# Altium footprint library LimeMicroAltiumLib_pcbLib_r05.PcbLib: 746 footprints (part 27 of 48)
Each footprint in its own frame and in the unit in brackets; x right, y up, seen from the top. Pads: shape width x height; smd on the part's side, far side on the other; paste and mask are expansions set on the pad; w line width, h text height; cw(c..) or ccw(c..) is an arc to the next point about the centre after c.
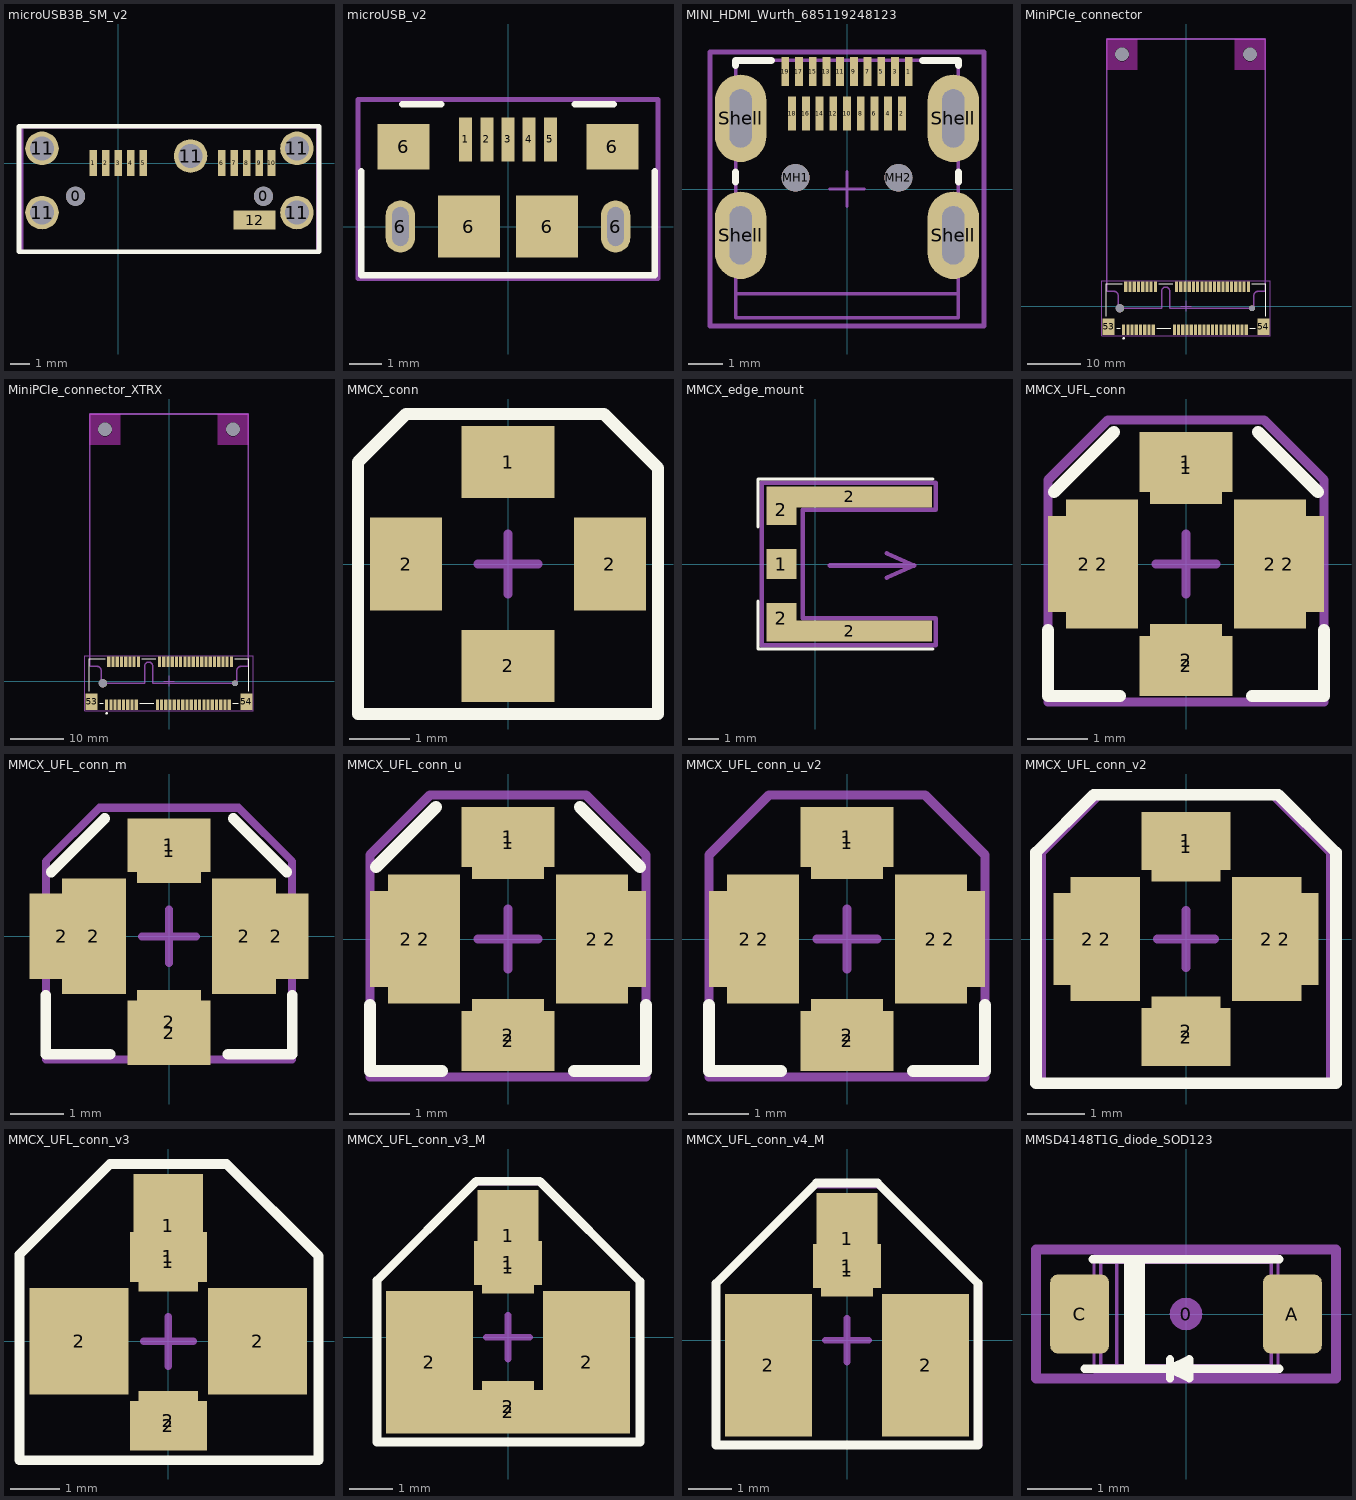
[diagram p26: the footprints below, top view; thin cyan lines are the x and y axes]

## microUSB3B_SM_v2 [mm] "GSB443T33HRCT-ND"
pads (18):
  round 1 hole 1: 0(-2.225,-1.73) 0(7.575,-1.73)
  rect 0.4x1.35 smd mask+0.05: 1(-1.3,0) 2(-0.65,0) 3(0,0) 4(0.65,0) 5(1.3,0) 6(5.4,0) 7(6.05,0) 8(6.7,0) 9(7.35,0) 10(8,0)
  round 1.75 hole 1.25: 11(-3.975,-2.58) 11(-3.975,0.77) 11(3.775,0.37) 11(9.325,-2.58) 11(9.325,0.77)
  rect 2.18x0.98 smd: 12(7.115,-2.97)
Top Overlay:
  lines w0.254: -5.175,-4.625 -5.175,1.925 10.475,1.925 10.475,-4.625 -5.175,-4.625
Mechanical 15:
  lines w0.15: -5.025,-4.625 -5.025,1.875 10.4,1.875 10.4,-4.625 -5.025,-4.625
  text ".Designator" at 2.675,-1.238 h0.55
3D body "USB3110-30-A_revF.step": height 5.73, standoff 2, extent -4.032,-6.525 9.382,-0.607
3D body: height 4, standoff 0, extent -4.032,-4.625 9.382,-0.607

## microUSB_v2 [mm]
pads (11):
  rect 0.4x1.35 smd mask+0.05: 1(-1.3,2.675) 2(-0.65,2.675) 3(0,2.675) 4(0.65,2.675) 5(1.3,2.675)
  oval 0.9x1.6 hole 0.5 slot 1.2 at 90 deg: 6(-3.3,0) 6(3.3,0)
  rect 1.6x1.4 smd: 6(-3.2,2.45) 6(3.2,2.45)
  rect 1.9x1.9 smd: 6(-1.2,0) 6(1.2,0)
Top Overlay:
  lines w0.2: -4.5,1.7 -4.5,-1.5 4.5,-1.5 4.5,1.7 ; -3.25,3.75 -2.05,3.75 ; 2.05,3.75 3.25,3.75
Mechanical 15:
  lines w0.15: -4.6,-1.6 4.6,-1.6 4.6,3.9 -4.6,3.9 -4.6,-1.6
  text ".Designator" at 0,1.3 h0.55
3D body "USB3090-30-A_revE.step": height 2.59, standoff -1, extent -3.891,-2.565 3.892,2.925

## MINI_HDMI_Wurth_685119248123 [mm] "Also compatible with Molex 0467651301 and Amphenol 10118242-001RLF"
height 3
pads (25):
  rect 0.23x0.85 smd: 1(1.8,3.425) 3(1.4,3.425) 5(1,3.425) 7(0.6,3.425) 9(0.2,3.425) 11(-0.2,3.425) 13(-0.6,3.425) 15(-1,3.425) 17(-1.4,3.425) 19(-1.8,3.425)
  rect 0.23x1 smd: 2(1.6,2.2) 4(1.2,2.2) 6(0.8,2.2) 8(0.4,2.2) 10(0,2.2) 12(-0.4,2.2) 14(-0.8,2.2) 16(-1.2,2.2) 18(-1.6,2.2)
  round 0.81 hole 0.81 unplated: MH1(-1.5,0.33) MH2(1.5,0.33)
  oval 1.5x2.55 hole 0.65 slot 1.7 at 90 deg: Shell(-3.1,-1.35) Shell(-3.1,2.06) Shell(3.1,-1.35) Shell(3.1,2.06)
Top Overlay:
  lines w0.2: -3.25,0.2 -3.25,0.5 ; -3.25,3.6 -3.25,3.75 -2.2,3.75 ; 2.2,3.75 3.25,3.75 3.25,3.6 ; 3.25,0.2 3.25,0.5
Mechanical 13:
  lines w0.1: -3.25,-3.75 -3.25,3.75 3.25,3.75 3.25,-3.75 -3.25,-3.75
Mechanical 15:
  lines w0.1: -3.25,-3.05 3.25,-3.05 ; -0.5,0 0.5,0 ; 0,-0.5 0,0.5
  lines w0.15: -4,-4 -4,4 4,4 4,-4 -4,-4
  text "PCB Edge" at -1.4,-2.8 h0.41
  text ".Designator" at 0,0 h0.55
3D body "685119248123.stp": height 2.99, standoff -1.11, extent -3.25,-3.75 3.25,3.755

## MiniPCIe_connector [mm]
pads (58):
  rect 0.6x2 smd paste+0 mask+0: 1(-11.8,-4.5) 2(-11.4,3.7) 3(-11,-4.5) 4(-10.6,3.7) 5(-10.2,-4.5) 6(-9.8,3.7) 7(-9.4,-4.5) 8(-9,3.7) 9(-8.6,-4.5) 10(-8.2,3.7) 11(-7.8,-4.5) 12(-7.4,3.7) 13(-7,-4.5) 14(-6.6,3.7) 15(-6.2,-4.5) 16(-5.8,3.7) 17(-2.2,-4.5) 18(-1.8,3.7) 19(-1.4,-4.5) 20(-1,3.7) 21(-0.6,-4.5) 22(-0.2,3.7) 23(0.2,-4.5) 24(0.6,3.7) 25(1,-4.5) 26(1.4,3.7) 27(1.8,-4.5) 28(2.2,3.7) 29(2.6,-4.5) 30(3,3.7) 31(3.4,-4.5) 32(3.8,3.7) 33(4.2,-4.5) 34(4.6,3.7) 35(5,-4.5) 36(5.4,3.7) 37(5.8,-4.5) 38(6.2,3.7) 39(6.6,-4.5) 40(7,3.7) 41(7.4,-4.5) 42(7.8,3.7) 43(8.2,-4.5) 44(8.6,3.7) 45(9,-4.5) 46(9.4,3.7) 47(9.8,-4.5) 48(10.2,3.7) 49(10.6,-4.5) 50(11,3.7) 51(11.4,-4.5) 52(11.8,3.7)
  rect 2.3x3.2 smd paste+0 mask+0: 53(-14.65,-3.9) 54(14.65,-3.9)
  round 2.3 hole 2.6 unplated: MH1(-12.1,47.65) MH2(12.1,47.65)
  round 1.6 hole 1.6 unplated paste-1000 mask+0: ""(-12.5,-0.4)
  round 1.1 hole 1.1 unplated paste-1000 mask+0: ""(12.5,-0.4)
Top Overlay:
  circle w0.25: c-11.8,-6.1 r0.125
  lines w0.2: -15.1,-1.925 -15.1,4.2 -12.075,4.2 ; -13.125,-4.2 -12.475,-4.2 ; -5.525,-4.2 -2.875,-4.2 ; -5.125,4.2 -2.475,4.2 ; 12.075,-4.2 13.125,-4.2 ; 12.475,4.2 15.1,4.2 15.1,-1.925
Keep-Out Layer:
  region: 9.2,44.75 9.2,50.55 15,50.55 15,44.75 hole: 13.411,47.65 13.367,47.989 13.236,48.306 13.027,48.577 12.756,48.786 12.439,48.917 12.1,48.961 11.761,48.917 11.444,48.786 11.173,48.577 10.964,48.306 10.833,47.989 10.789,47.65 10.833,47.311 10.964,46.994 11.173,46.723 11.444,46.514 11.761,46.383 12.1,46.339 12.439,46.383 12.756,46.514 13.027,46.723 13.236,46.994 13.367,47.311
  region: -9.2,44.75 -15,44.75 -15,50.55 -9.2,50.55 hole: -12.1,48.961 -12.439,48.917 -12.756,48.786 -13.027,48.577 -13.236,48.306 -13.367,47.989 -13.411,47.65 -13.367,47.311 -13.236,46.994 -13.027,46.723 -12.756,46.514 -12.439,46.383 -12.1,46.339 -11.761,46.383 -11.444,46.514 -11.173,46.723 -10.964,46.994 -10.833,47.311 -10.789,47.65 -10.833,47.989 -10.964,48.306 -11.173,48.577 -11.444,48.786 -11.761,48.917
Mechanical 15:
  lines w0.15: -1,0 0,0 ; 0,-1 0,0 ; 0,1 0,0 ; 1,0 0,0
  lines w0.2: -15.9,-5.6 15.9,-5.6 15.9,4.8 -15.9,4.8 -15.9,-5.6
  lines w0.3: -15,2.8 -15,50.55 15,50.55 15,2.8 13.65,2.8 ccw(c13.65,2) 12.85,2 12.85,-0.4 -3.1,-0.4 -3.1,2.85 ccw(c-3.85,2.85) -4.6,2.85 -4.6,-0.4 -12.85,-0.4 -12.85,2 ccw(c-13.65,2) -13.65,2.8 -15,2.8
  text "51" at 11.3,-4.8 h0.55
  text "52" at 11.7,3.5 h0.55
  text "2" at -11.5,3.5 h0.55
  text "1" at -11.8,-4.8 h0.55
  text ".Designator" at 0,0 h0.55
3D body "2041119-2.stp": height 4, standoff -0.65, extent -14.95,-4.98 14.95,4.11
3D body "LoRaWAN WM1302.STEP": height 4.6, standoff 0, extent -15,-0.4 15,50.6

## MiniPCIe_connector_XTRX [mm]
pads (58):
  rect 0.6x2 smd paste+0 mask+0: 1(-11.8,-4.5) 2(-11.4,3.7) 3(-11,-4.5) 4(-10.6,3.7) 5(-10.2,-4.5) 6(-9.8,3.7) 7(-9.4,-4.5) 8(-9,3.7) 9(-8.6,-4.5) 10(-8.2,3.7) 11(-7.8,-4.5) 12(-7.4,3.7) 13(-7,-4.5) 14(-6.6,3.7) 15(-6.2,-4.5) 16(-5.8,3.7) 17(-2.2,-4.5) 18(-1.8,3.7) 19(-1.4,-4.5) 20(-1,3.7) 21(-0.6,-4.5) 22(-0.2,3.7) 23(0.2,-4.5) 24(0.6,3.7) 25(1,-4.5) 26(1.4,3.7) 27(1.8,-4.5) 28(2.2,3.7) 29(2.6,-4.5) 30(3,3.7) 31(3.4,-4.5) 32(3.8,3.7) 33(4.2,-4.5) 34(4.6,3.7) 35(5,-4.5) 36(5.4,3.7) 37(5.8,-4.5) 38(6.2,3.7) 39(6.6,-4.5) 40(7,3.7) 41(7.4,-4.5) 42(7.8,3.7) 43(8.2,-4.5) 44(8.6,3.7) 45(9,-4.5) 46(9.4,3.7) 47(9.8,-4.5) 48(10.2,3.7) 49(10.6,-4.5) 50(11,3.7) 51(11.4,-4.5) 52(11.8,3.7)
  rect 2.3x3.2 smd paste+0 mask+0: 53(-14.65,-3.9) 54(14.65,-3.9)
  round 2.3 hole 2.6 unplated: MH1(-12.1,47.65) MH2(12.1,47.65)
  round 1.6 hole 1.6 unplated paste-1000 mask+0: ""(-12.5,-0.4)
  round 1.1 hole 1.1 unplated paste-1000 mask+0: ""(12.5,-0.4)
Top Overlay:
  circle w0.25: c-11.8,-6.1 r0.125
  lines w0.2: -15.1,-1.925 -15.1,4.2 -12.075,4.2 ; -13.125,-4.2 -12.475,-4.2 ; -5.525,-4.2 -2.875,-4.2 ; -5.125,4.2 -2.475,4.2 ; 12.075,-4.2 13.125,-4.2 ; 12.475,4.2 15.1,4.2 15.1,-1.925
Keep-Out Layer:
  region: 9.2,44.75 9.2,50.55 15,50.55 15,44.75 hole: 13.411,47.65 13.367,47.989 13.236,48.306 13.027,48.577 12.756,48.786 12.439,48.917 12.1,48.961 11.761,48.917 11.444,48.786 11.173,48.577 10.964,48.306 10.833,47.989 10.789,47.65 10.833,47.311 10.964,46.994 11.173,46.723 11.444,46.514 11.761,46.383 12.1,46.339 12.439,46.383 12.756,46.514 13.027,46.723 13.236,46.994 13.367,47.311
  region: -9.2,44.75 -15,44.75 -15,50.55 -9.2,50.55 hole: -12.1,48.961 -12.439,48.917 -12.756,48.786 -13.027,48.577 -13.236,48.306 -13.367,47.989 -13.411,47.65 -13.367,47.311 -13.236,46.994 -13.027,46.723 -12.756,46.514 -12.439,46.383 -12.1,46.339 -11.761,46.383 -11.444,46.514 -11.173,46.723 -10.964,46.994 -10.833,47.311 -10.789,47.65 -10.833,47.989 -10.964,48.306 -11.173,48.577 -11.444,48.786 -11.761,48.917
Mechanical 15:
  lines w0.15: -1,0 0,0 ; 0,-1 0,0 ; 0,1 0,0 ; 1,0 0,0
  lines w0.2: -15.9,-5.6 15.9,-5.6 15.9,4.8 -15.9,4.8 -15.9,-5.6
  lines w0.3: -15,2.8 -15,50.55 15,50.55 15,2.8 13.65,2.8 ccw(c13.65,2) 12.85,2 12.85,-0.4 -3.1,-0.4 -3.1,2.85 ccw(c-3.85,2.85) -4.6,2.85 -4.6,-0.4 -12.85,-0.4 -12.85,2 ccw(c-13.65,2) -13.65,2.8 -15,2.8
  text "51" at 11.3,-4.8 h0.55
  text "52" at 11.7,3.5 h0.55
  text "2" at -11.5,3.5 h0.55
  text "1" at -11.8,-4.8 h0.55
  text ".Designator" at 0,0 h0.55
3D body "2041119-2.stp": height 4, standoff -0.65, extent -14.95,-4.98 14.95,4.11
3D body "LimeSDR-XTRX_1v0_r1.step": height 6.63, standoff -0.35, extent -14.97,-0.4 15.57,50.4

## MMCX_conn [mm]
pads (4):
  rect 1.55x1.2 smd: 1(0,1.7) 2(0,-1.7)
  rect 1.2x1.55 smd: 2(-1.7,0) 2(1.7,0)
Top Overlay:
  lines w0.2: -2.5,-2.5 -2.5,1.7 -1.7,2.5 1.6,2.5 2.5,1.6 2.5,-2.5 -2.5,-2.5
Mechanical 15:
  lines w0.15: -0.5,0 0.5,0 ; 0,-0.5 0,0.5 ; -2.5,-2.5 2.5,-2.5 2.5,1.6 1.6,2.5 -1.7,2.5 -2.5,1.7 -2.5,-2.5
  text "in" at -0.4,1.425 h0.55
  text ".designator" at 0,0 h0.55
3D body "User Library-Molex_MMCX_734152061.step": height 5, standoff 0, extent -2.475,-2.475 2.475,2.475

## MMCX_edge_mount [mm]
pads (5):
  rect 1x1 smd mask+0.05: 1(-1.125,0) 2(-1.125,-1.8) 2(-1.125,1.8)
  rect 5.5x0.7 smd mask+0.05: 2(1.125,-2.225) 2(1.125,2.225)
Top Overlay:
  lines w0.1: -1.9,-1.225 -1.9,-2.825 3.9,-2.825 ; -1.9,1.225 -1.9,2.825 3.9,2.825
Mechanical 15:
  lines w0.15: 0.475,-0.05 3.275,-0.05 ; 2.375,-0.45 3.275,-0.05 ; 2.375,0.35 3.275,-0.05 ; -1.775,-2.7 -1.775,2.7 4,2.7 4,1.8 -0.425,1.8 -0.425,-1.8 4,-1.8 4,-2.7 -1.775,-2.7
  text ".Designator" at -1.15,-0.05 h0.55
  text "PCB cutout" at 0.175,1.15 h0.4
3D body "MMCX_CONN_90.STEP": height 2.1, standoff -1.41, extent -1.6,-2.235 3.85,2.235

## MMCX_UFL_conn [mm]
pads (8):
  rect 1.2x1.2 smd mask+0.05: 1(0,1.6) 2(0,-1.6)
  rect 1.55x1 smd mask+0.05: 1(0,1.7) 2(0,-1.7)
  rect 1.2x1.6 smd mask+0.05: 2(-1.7,0) 2(1.7,0)
  rect 1.2x2.15 smd mask+0.05: 2(-1.4,0) 2(1.4,0)
Top Overlay:
  lines w0.2: -2.3,-1.1 -2.3,-2.2 -1.1,-2.2 ; -2.2,1.2 -1.2,2.2 ; 1.1,-2.2 2.3,-2.2 2.3,-1.1 ; 1.2,2.2 2.2,1.2
Top Solder:
  region: -0.825,1.2 -0.575,1.2 -0.575,0.95 -0.825,0.95
  region: 0.825,1.2 0.575,1.2 0.575,0.95 0.825,0.95
  region: 0.825,-0.95 0.575,-0.95 0.575,-1.2 0.825,-1.2
  region: -0.575,-0.95 -0.825,-0.95 -0.825,-1.2 -0.575,-1.2
Mechanical 15:
  lines w0.15: -0.5,0 0.5,0 ; 0,-0.5 0,0.5 ; -2.3,-2.3 -2.3,1.4 -1.3,2.4 1.3,2.4 2.3,1.4 2.3,-2.3 -2.3,-2.3
  text ".designator" at 0,0 h0.55
  text "in" at -0.475,1.45 h0.55
3D body "User Library-Molex_MMCX_734152061.step": height 5, standoff 0, extent -2.475,-2.475 2.475,2.475
3D body "User Library-U_FL-R-SMT-1.step": height 1.25, standoff -0.01, extent -1.5,-1.55 1.5,1.55

## MMCX_UFL_conn_m [mm]
pads (8):
  rect 1.2x1.2 smd mask+0.05: 1(0,1.6) 2(0,-1.6)
  rect 1.55x1 smd mask+0.05: 1(0,1.7)
  rect 1.2x1.6 smd mask+0.05: 2(-2,0) 2(2,0)
  rect 1.2x2.15 smd mask+0.05: 2(-1.4,0) 2(1.4,0)
  rect 1.55x1.2 smd mask+0.05: 2(0,-1.8)
Top Overlay:
  lines w0.2: -2.3,-1.1 -2.3,-2.2 -1.1,-2.2 ; -2.2,1.2 -1.2,2.2 ; 1.1,-2.2 2.3,-2.2 2.3,-1.1 ; 1.2,2.2 2.2,1.2
Top Solder:
  region: -0.825,1.2 -0.575,1.2 -0.575,0.95 -0.825,0.95
  region: 0.825,1.2 0.575,1.2 0.575,0.95 0.825,0.95
  region: 0.825,-0.95 0.575,-0.95 0.575,-1.2 0.825,-1.2
  region: -0.575,-0.95 -0.825,-0.95 -0.825,-1.2 -0.575,-1.2
Mechanical 15:
  lines w0.15: -0.5,0 0.5,0 ; 0,-0.5 0,0.5 ; -2.3,-2.3 2.3,-2.3 2.3,1.4 1.3,2.4 -1.3,2.4 -2.3,1.4 -2.3,-2.3
  text "in" at -0.4,1.4 h0.55
  text ".designator" at 0,0 h0.55
3D body "908-22101T--3DModel-STEP-56544.STEP": height 3.61, standoff 0, extent -2.134,-2.159 2.184,2.159

## MMCX_UFL_conn_u [mm]
pads (8):
  rect 1.2x1.2 smd mask+0.05: 1(0,1.6) 2(0,-1.6)
  rect 1.55x1 smd mask+0.05: 1(0,1.7) 2(0,-1.7)
  rect 1.2x1.6 smd mask+0.05: 2(-1.7,0) 2(1.7,0)
  rect 1.2x2.15 smd mask+0.05: 2(-1.4,0) 2(1.4,0)
Top Overlay:
  lines w0.2: -2.3,-1.1 -2.3,-2.2 -1.1,-2.2 ; -2.2,1.2 -1.2,2.2 ; 1.1,-2.2 2.3,-2.2 2.3,-1.1 ; 1.2,2.2 2.2,1.2
Top Solder:
  region: -0.825,1.2 -0.575,1.2 -0.575,0.95 -0.825,0.95
  region: 0.825,1.2 0.575,1.2 0.575,0.95 0.825,0.95
  region: 0.825,-0.95 0.575,-0.95 0.575,-1.2 0.825,-1.2
  region: -0.575,-0.95 -0.825,-0.95 -0.825,-1.2 -0.575,-1.2
Mechanical 15:
  lines w0.15: -0.5,0 0.5,0 ; 0,-0.5 0,0.5 ; -2.3,-2.3 -2.3,1.4 -1.3,2.4 1.3,2.4 2.3,1.4 2.3,-2.3 -2.3,-2.3
  text ".designator" at 0,0 h0.55
  text "in" at -0.5,1.4 h0.55
3D body "User Library-U_FL-R-SMT-1.step": height 1.25, standoff -0.01, extent -1.5,-1.55 1.5,1.55

## MMCX_UFL_conn_u_v2 [mm] "Less silkscreen"
pads (8):
  rect 1.2x1.2 smd mask+0.05: 1(0,1.6) 2(0,-1.6)
  rect 1.55x1 smd mask+0.05: 1(0,1.7) 2(0,-1.7)
  rect 1.2x1.6 smd mask+0.05: 2(-1.7,0) 2(1.7,0)
  rect 1.2x2.15 smd mask+0.05: 2(-1.4,0) 2(1.4,0)
Top Overlay:
  lines w0.2: -2.3,-1.1 -2.3,-2.2 -1.1,-2.2 ; 1.1,-2.2 2.3,-2.2 2.3,-1.1
Top Solder:
  region: -0.575,-0.95 -0.825,-0.95 -0.825,-1.2 -0.575,-1.2
  region: 0.825,-0.95 0.575,-0.95 0.575,-1.2 0.825,-1.2
  region: 0.825,1.2 0.575,1.2 0.575,0.95 0.825,0.95
  region: -0.825,1.2 -0.575,1.2 -0.575,0.95 -0.825,0.95
Mechanical 15:
  lines w0.15: -0.5,0 0.5,0 ; 0,-0.5 0,0.5 ; -2.3,-2.3 -2.3,1.4 -1.3,2.4 1.3,2.4 2.3,1.4 2.3,-2.3 -2.3,-2.3
  text ".designator" at 0,0 h0.55
  text "in" at -0.5,1.425 h0.55
3D body "User Library-U_FL-R-SMT-1.step": height 1.25, standoff -0.01, extent -1.5,-1.55 1.5,1.55

## MMCX_UFL_conn_v2 [mm]
pads (8):
  rect 1.2x1.2 smd mask+0.05: 1(0,1.6) 2(0,-1.6)
  rect 1.55x1 smd mask+0.05: 1(0,1.7) 2(0,-1.7)
  rect 1.2x1.6 smd mask+0.05: 2(-1.7,0) 2(1.7,0)
  rect 1.2x2.15 smd mask+0.05: 2(-1.4,0) 2(1.4,0)
Top Overlay:
  lines w0.2: -2.6,-2.5 2.6,-2.5 2.6,1.5 1.6,2.5 -1.6,2.5 -2.6,1.5 -2.6,-2.5
Top Solder:
  region: -0.575,-0.95 -0.825,-0.95 -0.825,-1.2 -0.575,-1.2
  region: 0.825,-0.95 0.575,-0.95 0.575,-1.2 0.825,-1.2
  region: 0.825,1.2 0.575,1.2 0.575,0.95 0.825,0.95
  region: -0.825,1.2 -0.575,1.2 -0.575,0.95 -0.825,0.95
Mechanical 15:
  lines w0.15: -0.5,0 0.5,0 ; 0,-0.5 0,0.5 ; -2.5,-2.5 -2.5,1.5 -1.5,2.5 1.5,2.5 2.5,1.5 2.5,-2.5 -2.5,-2.5
  text ".designator" at 0,0 h0.55
  text "in" at -0.45,1.45 h0.55
3D body "User Library-U_FL-R-SMT-1.step": height 1.25, standoff -0.01, extent -1.5,-1.55 1.5,1.55
3D body "User Library-Molex_MMCX_734152061.step": height 5, standoff 0, extent -2.475,-2.475 2.475,2.475

## MMCX_UFL_conn_v3 [mm]
pads (7):
  rect 1.2x1.2 smd mask+0.05: 1(0,1.6) 2(0,-1.6)
  rect 1.55x1 smd mask+0.05: 1(0,1.7) 2(0,-1.7)
  rect 1.4x2.1 smd mask+0.05: 1(0,2.325)
  rect 2x2.15 smd mask+0.05: 2(-1.8,0) 2(1.8,0)
Top Overlay:
  lines w0.2: -3,-2.4 3.025,-2.4 3.025,1.725 1.175,3.575 -1.175,3.575 -3,1.75 -3,-2.4
Top Solder:
  region: -0.825,1.2 -0.575,1.2 -0.575,0.95 -0.825,0.95
  region: 0.825,1.2 0.575,1.2 0.575,0.95 0.825,0.95
  region: 0.825,-0.95 0.575,-0.95 0.575,-1.2 0.825,-1.2
  region: -0.575,-0.95 -0.825,-0.95 -0.825,-1.2 -0.575,-1.2
Mechanical 15:
  lines w0.15: -0.5,0 0.5,0 ; 0,-0.5 0,0.5 ; -3,-2.4 -3,1.75 -1.2,3.55 1.2,3.55 3.025,1.725 3.025,-2.4 -3,-2.4
  text ".designator" at 0,0 h0.55
  text "in" at -0.525,1.5 h0.55
3D body "12078.stp": height 5, standoff 0, extent -2.5,-1.55 2.5,3.45
3D body "User Library-U_FL-R-SMT-1.step": height 1.25, standoff -0.01, extent -1.5,-1.55 1.5,1.55
3D body "User Library-Molex_MMCX_734152061.step": height 5, standoff 0, extent -2.475,-2.475 2.475,2.475

## MMCX_UFL_conn_v3_M [mm]
pads (7):
  rect 1.2x1.2 smd mask+0.05: 1(0,1.6) 2(0,-1.6)
  rect 1.55x1 smd mask+0.05: 1(0,1.7)
  rect 1.4x2.1 smd mask+0.05: 1(0,2.325)
  rect 2x3.275 smd mask+0.05: 2(-1.8,-0.575) 2(1.8,-0.575)
  rect 1.6x1 smd mask+0.05: 2(0,-1.713)
Top Overlay:
  lines w0.2: -3,-2.4 3.025,-2.4 3.025,1.275 0.725,3.575 -0.725,3.575 -3,1.3 -3,-2.4
Top Solder:
  region: -0.825,1.2 -0.575,1.2 -0.575,0.95 -0.825,0.95
  region: 0.825,1.2 0.575,1.2 0.575,0.95 0.825,0.95
  region: 0.825,-0.95 0.575,-0.95 0.575,-1.2 0.825,-1.2
  region: -0.575,-0.95 -0.825,-0.95 -0.825,-1.2 -0.575,-1.2
Mechanical 15:
  lines w0.15: -0.5,0 0.5,0 ; 0,-0.5 0,0.5 ; -3,-2.4 -3,1.3 -0.75,3.55 0.75,3.55 3.025,1.275 3.025,-2.4 -3,-2.4
  text ".designator" at 0,0 h0.55
  text "in" at -0.475,1.475 h0.55
3D body "12078.stp": height 5, standoff 0, extent -2.5,-2.425 2.5,2.575

## MMCX_UFL_conn_v4_M [mm]
pads (5):
  rect 1.2x1.2 smd mask+0.05: 1(0,1.6)
  rect 1.55x1 smd mask+0.05: 1(0,1.7)
  rect 1.4x2.1 smd mask+0.05: 1(0,2.325)
  rect 2x3.275 smd mask+0.05: 2(-1.8,-0.575) 2(1.8,-0.575)
Top Overlay:
  lines w0.2: -3,-2.4 -3,1.3 -0.7,3.6 0.7,3.6 3,1.3 3,-2.4 0,-2.4 -3,-2.4
Top Solder:
  region: -0.825,1.2 -0.575,1.2 -0.575,0.95 -0.825,0.95
  region: 0.825,1.2 0.575,1.2 0.575,0.95 0.825,0.95
Mechanical 15:
  lines w0.15: -0.5,0 0.5,0 ; 0,-0.5 0,0.5 ; -3,-2.4 -3,1.3 -0.75,3.55 0.75,3.55 3.025,1.275 3.025,-2.4 -3,-2.4
  text ".designator" at 0,0 h0.55
  text "in" at -0.4,1.475 h0.55
3D body "12078.stp": height 5, standoff 0, extent -2.5,-2.425 2.5,2.575

## MMSD4148T1G_diode_SOD123 [mm]
height 1.15
pads (3):
  round 0.508 on Mech15: 0(0,0)
  rrect25% 0.91x1.22 smd: A(1.65,0) C(-1.65,0)
Top Overlay:
  lines w0.127: -1.575,-0.85 1.448,-0.85 ; -1.45,0.85 1.45,0.85 ; -0.9,-0.85 -0.9,0.85 ; -0.8,-0.85 -0.8,0.85 ; -0.7,-0.85 -0.7,0.85 ; -0.25,-1 -0.25,-0.7 ; 0.05,-0.85 -0.25,-0.85 ; -0.25,-0.85 0.05,-0.7 0.05,-1 -0.25,-0.85
Mechanical 13:
  lines w0.05: -1.766,-0.308 -1.766,0.308 ; -1.707,-0.308 -1.707,0.308 ; -1.517,-0.308 -1.517,0.308 ; -1.425,-0.308 -1.95,-0.308 -1.95,0.308 -1.425,0.308 ; 0.075,-0.9 0.177,-0.798 ; 1.425,-0.308 1.95,-0.308 1.95,0.308 1.425,0.308 ; 1.517,-0.308 1.517,0.308 ; 1.707,-0.308 1.707,0.308 ; 1.766,-0.308 1.766,0.308 ; -1.425,0.9 -1.425,-0.9 1.425,-0.9 ; -1.425,0.9 1.425,0.9 ; -1.425,0.9 -1.323,0.798 ; -1.323,0.798 -1.323,-0.798 -1.072,-0.798 ; -1.323,0.798 -1.072,0.798 ; -1.072,-0.798 -1.072,0.798 ; -1.072,-0.798 1.322,-0.797 ; -1.072,0.798 1.322,0.797 ; 1.322,-0.797 1.425,-0.9 ; 1.322,-0.797 1.322,0.797 ; 1.322,0.797 1.425,0.9 ; 1.425,-0.9 1.425,0.9
Mechanical 15:
  lines w0.15: -2.325,-1 -2.325,1 2.325,1 2.325,-1 -2.325,-1
  text ".Designator" at 0,0 h0.55
  text "C" at -1.9,-0.275 h0.55
  text "A" at 1.475,-0.275 h0.55
3D body "SOD123.STEP": height 1.18, standoff 0, extent -1.95,-0.9 1.95,0.9